# Altium integrated library 刘兴达Lib.IntLib: 614 symbols (part 1 of 4)
Pins are listed as number, name and electrical type; pins without a type are passive.

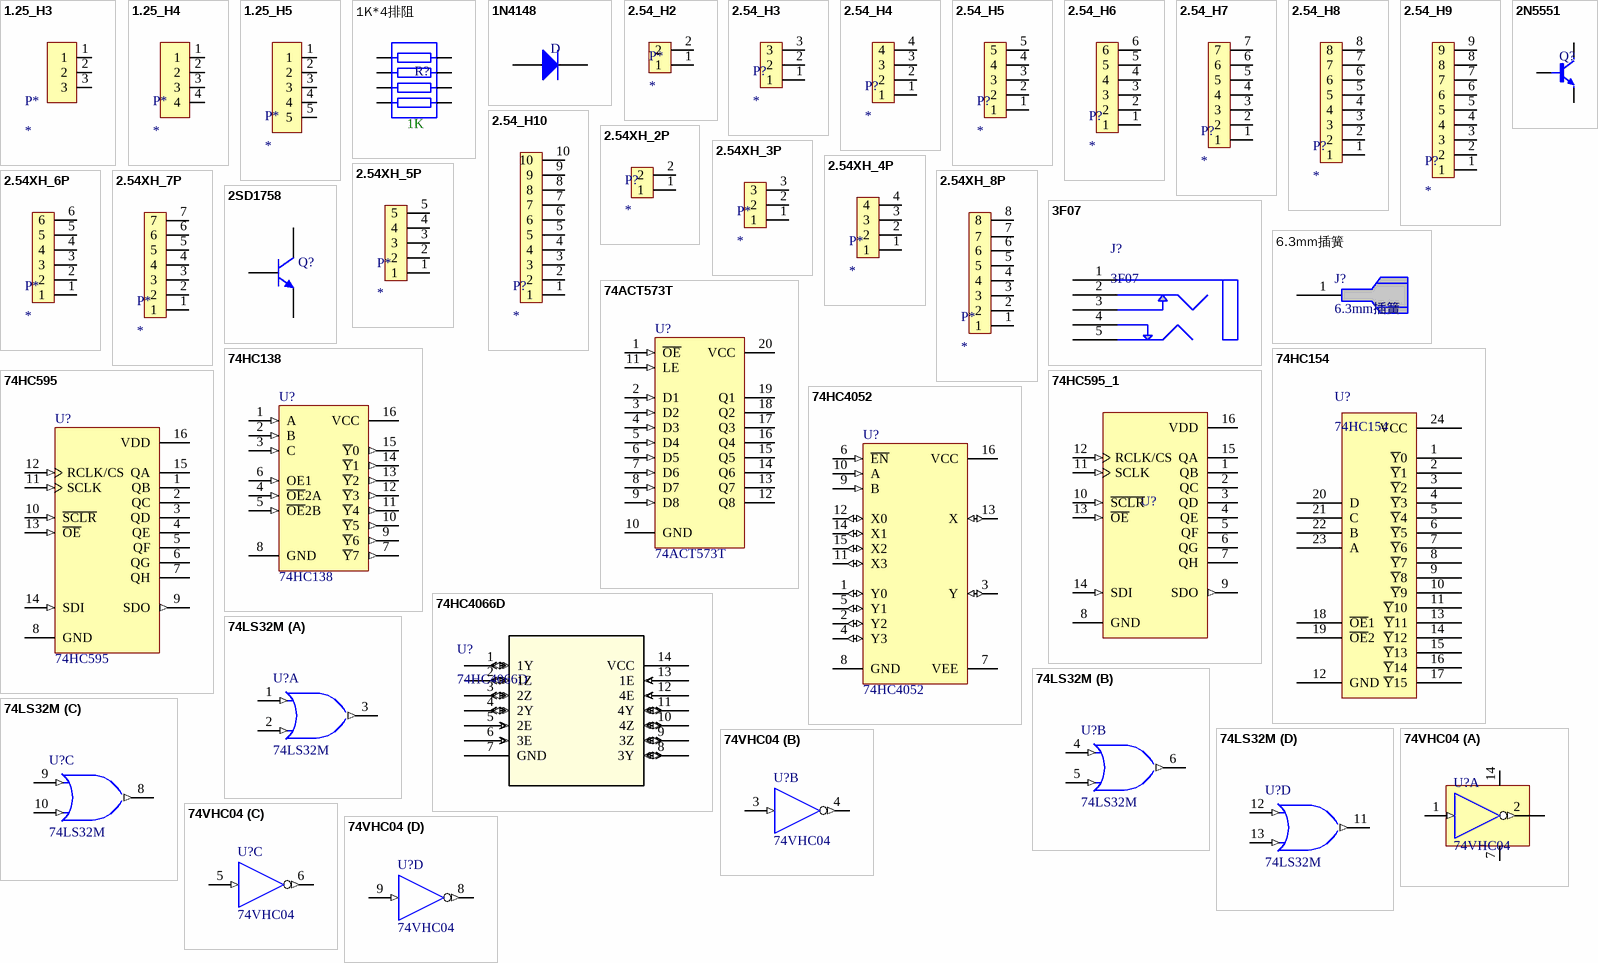
[diagram p0: symbols 1.25_H3 to 74VHC04]

## 1.25_H3
designator P*
footprint 1.25_H3_L
pins: 1, 2, 3

## 1.25_H4
designator P*
footprint 1.25_H4_L
pins: 1, 2, 3, 4

## 1.25_H5
designator P*
footprint 1.25_H5_L
pins: 1, 2, 3, 4, 5

## 1K*4排阻
designator R?  (value not drawn)
footprint 1K*4排阻
pins: 1, 2, 3, 4, 5, 6, 7, 8
text: 1K

## 1N4148
designator D  (value not drawn)
footprint 1N4148
pins: 1 A, 2 K

## 2.54_H2
designator P*
插针
footprint 2.54H_2P
pins: 1, 2

## 2.54_H3
designator P?
插针
footprint 2.54H_3P
pins: 1, 2, 3

## 2.54_H4
designator P?
插针
footprint 2.54H_4P
pins: 1, 2, 3, 4

## 2.54_H5
designator P?
插针
footprint 2.54_H5
footprint 2.54H_5P
pins: 1, 2, 3, 4, 5

## 2.54_H6
designator P?
插针
footprint 2.54H_6P
pins: 1, 2, 3, 4, 5, 6

## 2.54_H7
designator P?
插针
footprint 2.54H_7P
pins: 1, 2, 3, 4, 5, 6, 7

## 2.54_H8
designator P?
插针
footprint 2.54H_8P
pins: 1, 2, 3, 4, 5, 6, 7, 8

## 2.54_H9
designator P?
插针
footprint 2.54H_9P
pins: 1, 2, 3, 4, 5, 6, 7, 8, 9

## 2.54_H10
designator P?
插针
footprint 2.54H_10P
pins: 1, 2, 3, 4, 5, 6, 7, 8, 9, 10

## 2.54XH_2P
designator P?
footprint 2.54XH_2P_L (躺倒的连接器)
footprint 2.54XH_2P_S (垂直的连接器)
pins: 1, 2

## 2.54XH_3P
designator P*
footprint 2.54XH_3P_L (躺倒的插口)
footprint 2.54XH_3P_S (垂直的连接器)
pins: 1, 2, 3

## 2.54XH_4P
designator P*
footprint 2.54XH_4P_L (躺倒的插口)
footprint 2.54XH_4P_S (垂直的连接器)
pins: 1, 2, 3, 4

## 2.54XH_5P
designator P*
footprint 2.54XH_5P_L (躺到的插口)
footprint 2.54XH_5P_S (垂直的连接器)
pins: 1, 2, 3, 4, 5

## 2.54XH_6P
designator P*
footprint 2.54XH_6P_L (躺倒的接口)
footprint 2.54XH_6P_S (垂直的连接器)
pins: 1, 2, 3, 4, 5, 6

## 2.54XH_7P
designator P*
footprint 2.54XH_7P_S
footprint 2.54XH_7P_L
pins: 1, 2, 3, 4, 5, 6, 7

## 2.54XH_8P
designator P*
footprint 2.54XH_8P_S
footprint 2.54XH_8P_L
pins: 1, 2, 3, 4, 5, 6, 7, 8

## 2N5551
designator Q?  (value not drawn)
NPN三极管
footprint 2N5551
pins: 1 b, 2 e, 3 c

## 2SD1758
designator Q?
10W PNP; Published: 8-Jun-2000; LatestRevisionDate: 15-Jan-2003; LatestRevisionNote: PCB Footprint 'BCY-W3/D4.7' replaced; DatasheetVersion: 1997; PackageVersion: Sep-1998; PackageReference: TO-92A; Publisher: Altium Limited; PackageDescription: TO, Flat Index; 3 In-Line, Axial Leads; Body Dia. 4.5mm; Leads 0.51 x 0.48 mm (max); ComponentLink1Description: Manufacturer Link; ComponentLink1URL: http://www.fairchildsemi.com/; ComponentLink2Description: Datasheet; ComponentLink2URL: http://www.fairchildsemi.com/ds/2N%2F2N3904.pdf
footprint TO-252-2
pins: 1 B, 2 C, 3 E

## 3F07
designator J?
立体声耳机插座
footprint 3F07 (立体声耳机插座)
pins: 1 COM, 2 R1, 3 R2, 4 L2, 5 L1

## 6.3mm插簧
designator J?
pins: 1

## 74ACT573T
designator U?
双向数据传输; Published: 8-Jun-2000; LatestRevisionDate: 06-Jun-2005; LatestRevisionNote: Stylized 3D Model Added.; DatasheetVersion: May-1999; PackageReference: TSSOP20; Publisher: Altium Limited; PackageDescription: Shrink Small Outline; 20 Leads; Body Width 4.4 mm; Pitch 0.65 mm; ComponentLink1Description: Manufacturer Link; ComponentLink1URL: http://www.st.com/; ComponentLink2Description: Datasheet; ComponentLink2URL: http://www.st.com/stonline/products/literature/ds/4820/74act573.pdf
footprint TSSOP-20
footprint SOP-20
pins: 1 ~{OE} (in), 2 D1 (in), 3 D2 (in), 4 D3 (in), 5 D4 (in), 6 D5 (in), 7 D6 (in), 8 D7 (in), 9 D8 (in), 10 GND (power), 11 LE (in), 12 Q8 (hiz), 13 Q7 (hiz), 14 Q6 (hiz), 15 Q5 (hiz), 16 Q4 (hiz), 17 Q3 (hiz), 18 Q2 (hiz), 19 Q1 (hiz), 20 VCC (power)

## 74HC138
designator U?
138译码器; Published: 17-Jul-2002; LatestRevisionDate: 13-Apr-2006; LatestRevisionNote: IPC-7351 Footprint Added.; DatasheetVersion: Nov-1999; PackageVersion: 2000; PackageReference: M16D; Publisher: Altium Limited; PackageDescription: 16-Pin Small Outline Package 1.27 mm Pitch; ComponentLink1Description: Manufacturer Link; ComponentLink1URL: http://www.fairchildsemi.com/; ComponentLink2Description: Datasheet; ComponentLink2URL: http://www.fairchildsemi.com/ds/74%2F74AC138.pdf
footprint SOIC-16
footprint DIP-16 (双列直插)
pins: 1 A (in), 2 B (in), 3 C (in), 4 ~{OE}2A (in), 5 ~{OE}2B (in), 6 OE1 (in), 7 ~{Y}7 (out), 8 GND (power), 9 ~{Y}6 (out), 10 ~{Y}5 (out), 11 ~{Y}4 (out), 12 ~{Y}3 (out), 13 ~{Y}2 (out), 14 ~{Y}1 (out), 15 ~{Y}0 (out), 16 VCC (power)

## 74HC154
designator U?
4-16译码器
footprint SOIC-24 (74hc154)
footprint DIP-24 (DIP; 24,74ls154)
pins: 1 ~{Y}0 (power), 2 ~{Y}1 (power), 3 ~{Y}2 (power), 4 ~{Y}3 (power), 5 ~{Y}4 (power), 6 ~{Y}5 (power), 7 ~{Y}6 (power), 8 ~{Y}7 (power), 9 ~{Y}8 (power), 10 ~{Y}9 (power), 11 ~{Y}10 (power), 12 GND (power), 13 ~{Y}11 (power), 14 ~{Y}12 (power), 15 ~{Y}13 (power), 16 ~{Y}14 (power), 17 ~{Y}15 (power), 18 ~{OE}1 (power), 19 ~{OE}2 (power), 20 D (power), 21 C (power), 22 B (power), 23 A (power), 24 VCC (power)

## 74HC595
designator U?
移位寄存器; ComponentAvailability: Not for New Design; Published: 15-Apr-2002; LatestRevisionDate: 13-Apr-2006; LatestRevisionNote: IPC-7351 Footprint Added.; DatasheetVersion: 1997; PackageVersion: 1997; PackageReference: 966-01; Publisher: Altium Limited; PackageDescription: 16-Pin Small Outline Package 1.27 mm Pitch; ComponentLink1Description: Manufacturer Link; ComponentLink1URL: http://www.onsemi.com/; ComponentLink2Description: Datasheet; ComponentLink2URL: http://www.onsemi.com/pub/Collateral/MC74VHC595-D.PDF
footprint DIP-16 (双列直插)
footprint SOIC-16
pins: 1 QB (hiz), 2 QC (hiz), 3 QD (hiz), 4 QE (hiz), 5 QF (hiz), 6 QG (hiz), 7 QH (hiz), 8 GND (power), 9 SDO (out), 10 ~{SCLR} (in), 11 SCLK (in), 12 RCLK/CS (in), 13 ~{OE} (in), 14 SDI (in), 15 QA (hiz), 16 VDD (power)

## 74HC595_1
designator U?  (value not drawn)
锁存器
footprint 74HC595
pins: 1 QB (hiz), 2 QC (hiz), 3 QD (hiz), 4 QE (hiz), 5 QF (hiz), 6 QG (hiz), 7 QH (hiz), 8 GND (power), 9 SDO (out), 10 ~{SCLR} (in), 11 SCLK (in), 12 RCLK/CS (in), 13 ~{OE} (in), 14 SDI (in), 15 QA (hiz), 16 VDD (power)

## 74HC4052
designator U?
双通道模拟开关; Published: 8-Jun-2000; LatestRevisionDate: 13-Apr-2006; LatestRevisionNote: IPC-7351 Footprint Added.; DatasheetVersion: Oct-1993; PackageVersion: May-1998; PackageReference: SO16; Publisher: Altium Limited; PackageDescription: 16-Pin Small Outline Integrated Circuit 1.27 mm Pitch; Code_IPC: SOIC127P600-16; ComponentLink1Description: Manufacturer Link; ComponentLink1URL: http://www.st.com/; ComponentLink2Description: Datasheet; ComponentLink2URL: http://www.st.com/stonline/products/literature/ds/7730/m74hc4052.pdf
footprint SOIC-16
footprint DIP-16 (双列直插)
pins: 1 Y0 (io), 2 Y2 (io), 3 Y (io), 4 Y3 (io), 5 Y1 (io), 6 ~{EN} (in), 7 VEE (power), 8 GND (power), 9 B (in), 10 A (in), 11 X3 (io), 12 X0 (io), 13 X (io), 14 X1 (io), 15 X2 (io), 16 VCC (power)

## 74HC4066D
designator U?
Vendor: Nexperia; SourceLibrary: Nexperia_2018-05-2018; Manufacturer_Part_Number: 74HC4066D; Copyright: Copyright (C) 2016 Accelerated Designs. All rights reserved; RefDes: RefDes; Type: DEV
footprint TSSOP-14
pins: 1 1Y (io), 2 1Z (io), 3 2Z (io), 4 2Y (io), 5 2E (in), 6 3E (in), 7 GND (power), 8 3Y (io), 9 3Z (io), 10 4Z (io), 11 4Y (io), 12 4E (in), 13 1E (in), 14 VCC (power)

## 74LS32M
designator U?
双输入或门; Published: 15-Apr-2002; LatestRevisionDate: 13-Apr-2006; LatestRevisionNote: IPC-7351 Footprint Added.; DatasheetVersion: May-1989; PackageVersion: 2000; PackageReference: M14A; Publisher: Altium Limited; PackageDescription: 14-Pin Small Outline Integrated Circuit 1.27 mm Pitch; Code_IPC: SOIC127P600-14; ComponentLink1Description: Manufacturer Link; ComponentLink1URL: http://www.national.com/; ComponentLink2Description: Datasheet; ComponentLink2URL: http://www.national.com/ds.cgi/54/54LS32.pdf; ComponentLink3Description: URL Link1; ComponentLink3URL: http://www.national.com/pf/DM/DM54LS32.html
footprint SOIC-14 (SOP, 14-Leads,)
pins on every part: 7 GND (power) hidden to GND, 14 VCC (power) hidden to VCC
part A pins: 1 A (in), 2 B (in), 3 Y (out)
part B pins: 4 A (in), 5 B (in), 6 Y (out)
part C pins: 8 Y (out), 9 A (in), 10 B (in)
part D pins: 11 Y (out), 12 A (in), 13 B (in)

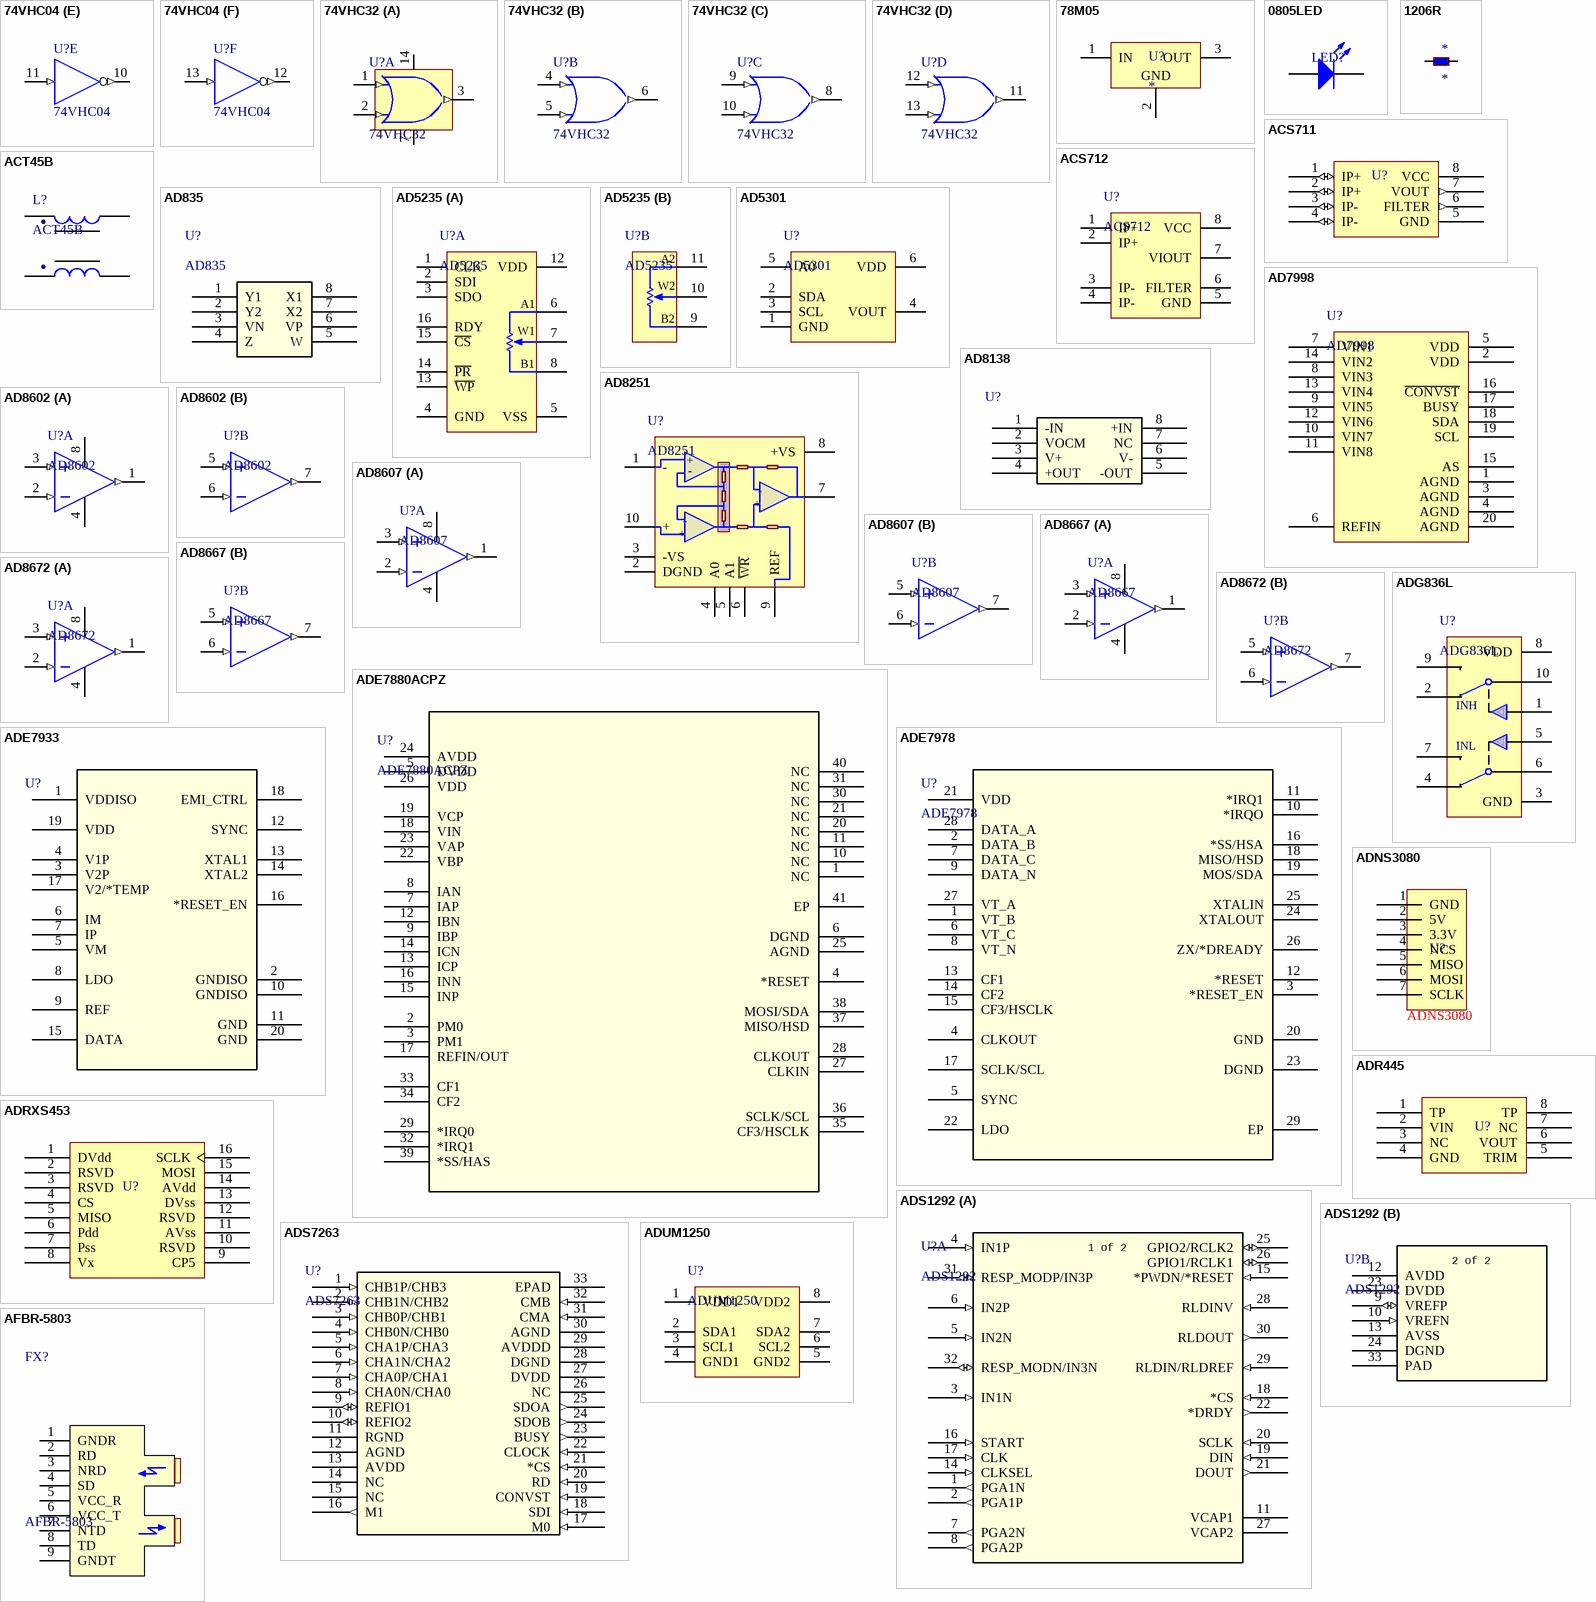
[diagram p1: symbols 74VHC04 to AFBR-5803]

## 74VHC04
designator U?
非门; IC_Technology: S; Published: 17-Jul-2002; LatestRevisionDate: 13-Apr-2006; LatestRevisionNote: IPC-7351 Footprint Added.; DatasheetVersion: Mar-1998; PackageVersion: 2000; PackageReference: M14A; Publisher: Altium Limited; PackageDescription: 14-Pin Small Outline Integrated Circuit 1.27 mm Pitch; Code_IPC: SOIC127P600-14; ComponentLink1Description: Manufacturer Link; ComponentLink1URL: http://www.fairchildsemi.com/
footprint SOIC-14 (SOP, 14-Leads,)
part A pins: 1 A (in), 2 Y (out), 7 GND (power), 14 VCC (power)
part B pins: 3 A (in), 4 Y (out)
part C pins: 5 A (in), 6 Y (out)
part D pins: 8 Y (out), 9 A (in)
part E pins: 10 Y (out), 11 A (in)
part F pins: 12 Y (out), 13 A (in)

## 74VHC32
designator U?
双输入或门; Published: 15-Apr-2002; LatestRevisionDate: 13-Apr-2006; LatestRevisionNote: IPC-7351 Footprint Added.; DatasheetVersion: May-1989; PackageVersion: 2000; PackageReference: M14A; Publisher: Altium Limited; PackageDescription: 14-Pin Small Outline Integrated Circuit 1.27 mm Pitch; Code_IPC: SOIC127P600-14; ComponentLink1Description: Manufacturer Link; ComponentLink1URL: http://www.national.com/; ComponentLink2Description: Datasheet; ComponentLink2URL: http://www.national.com/ds.cgi/54/54LS32.pdf; ComponentLink3Description: URL Link1; ComponentLink3URL: http://www.national.com/pf/DM/DM54LS32.html
footprint SOIC-14 (SOP, 14-Leads,)
part A pins: 1 A (in), 2 B (in), 3 Y (out), 7 GND (power), 14 VCC (power)
part B pins: 4 A (in), 5 B (in), 6 Y (out)
part C pins: 8 Y (out), 9 A (in), 10 B (in)
part D pins: 11 Y (out), 12 A (in), 13 B (in)

## 78M05
designator U?
5V稳压
footprint 78M05
pins: 1 IN (power), 2 GND (power), 3 OUT (power)

## 0805LED
designator LED?  (value not drawn)
footprint LED-0805 (贴片LED)
pins: 1 A, 2 K

## 1206R
designator *
电阻1206
footprint 1206
pins: 1, 2

## ACS711
designator U?  (value not drawn)
霍尔电流采样
footprint SOIC-NB-8
pins: 1 IP+ (io), 2 IP+ (io), 3 IP- (io), 4 IP- (io), 5 GND (power), 6 FILTER (out), 7 VOUT (out), 8 VCC (power)

## ACS712
designator U?
电流检测芯片
footprint SOIC-8
pins: 1 IP+, 2 IP+, 3 IP-, 4 IP-, 5 GND, 6 FILTER, 7 VIOUT, 8 VCC

## ACT45B
designator L?
共模电感
footprint L-TDK
pins: 1, 2, 3, 4
text: .

## AD835
designator U?
乘法器; Manufacturer_Part_Number: AD835ARZ; Vendor: Vendor; Value: Value; Type: Type; RefDes: Refdes
footprint SOIC-8 (3mm)
pins: 1 Y1, 2 Y2, 3 VN (power), 4 Z, 5 W, 6 VP (power), 7 X2, 8 X1

## AD5235
designator U?
数控电阻
footprint TSSOP-16 (TSOP, 16-Leads, Body 5x4.4mm, Pitch 0.65mm, IPC Low Density)
part A pins: 1 CLK, 2 SDI, 3 SDO, 4 GND, 5 VSS, 6 A1, 7 W1, 8 B1, 12 VDD, 13 ~{WP}, 14 ~{PR}, 15 ~{CS}, 16 RDY
part B pins: 9 B2, 10 W2, 11 A2

## AD5301
designator U?
DAC
footprint SOT23-6 (Max4173)
pins: 1 GND, 2 SDA, 3 SCL, 4 VOUT, 5 A0, 6 VDD

## AD7998
designator U?
12BIT,ADC
footprint TSSOP-20
pins: 1 AGND, 2 VDD, 3 AGND, 4 AGND, 5 VDD, 6 REFIN, 7 VIN1, 8 VIN3, 9 VIN5, 10 VIN7, 11 VIN8, 12 VIN6, 13 VIN4, 14 VIN2, 15 AS, 16 ~{CONVST}, 17 BUSY, 18 SDA, 19 SCL, 20 AGND

## AD8138
designator U?
全差分运放; Manufacturer_Part_Number: AD8138ARZ; Vendor: Vendor; Value: Value; Type: Type; RefDes: Refdes
footprint SOIC-8 (3mm)
pins: 1 -IN, 2 VOCM, 3 V+ (power), 4 +OUT, 5 -OUT, 6 V- (power), 7 NC, 8 +IN

## AD8251
designator U?
可控增益运放
footprint MSOP-10 (TSSOP)
pins: 1 -, 2 DGND, 3 -VS, 4 A0, 5 A1, 6 ~{WR}, 7 OUT, 8 +VS, 9  REF, 10 +

## AD8602
designator U?
双运放
footprint SOIC-8
part A pins: 1 OUT (out), 2 IN- (in), 3 IN+ (in), 4 V-, 8 V+
part B pins: 5 IN+ (in), 6 IN- (in), 7 OUT (out)

## AD8607
designator U?
双运放
footprint SOIC-8
part A pins: 1 OUT (out), 2 IN- (in), 3 IN+ (in), 4 V-, 8 V+
part B pins: 5 IN+ (in), 6 IN- (in), 7 OUT (out)

## AD8667
designator U?
双运放
footprint SOIC-8
part A pins: 1 OUT (out), 2 IN- (in), 3 IN+ (in), 4 V-, 8 V+
part B pins: 5 IN+ (in), 6 IN- (in), 7 OUT (out)

## AD8672
designator U?
双运放
footprint SOIC-8
part A pins: 1 OUT (out), 2 IN- (in), 3 IN+ (in), 4 V-, 8 V+
part B pins: 5 IN+ (in), 6 IN- (in), 7 OUT (out)

## ADE7880ACPZ
designator U?
三相电能计量; Vendor: Analog Devices Inc; Built_By: Analog Devices Inc.; Manufacturer_Part_Number: ADE7880ACPZ; Copyright: Copyright (C) 2018 Accelerated Designs. All rights reserved; RefDes: RefDes; Type: DEV; Value: Value
footprint LFCSP-40
pins: 1 NC, 2 PM0, 3 PM1, 4 *RESET, 5 DVDD, 6 DGND, 7 IAP, 8 IAN, 9 IBP, 10 NC, 11 NC, 12 IBN, 13 ICP, 14 ICN, 15 INP, 16 INN, 17 REFIN/OUT, 18 VIN, 19 VCP, 20 NC, 21 NC, 22 VBP, 23 VAP, 24 AVDD, 25 AGND, 26 VDD, 27 CLKIN, 28 CLKOUT, 29 *IRQ0, 30 NC, 31 NC, 32 *IRQ1, 33 CF1, 34 CF2, 35 CF3/HSCLK, 36 SCLK/SCL, 37 MISO/HSD, 38 MOSI/SDA, 39 *SS/HAS, 40 NC, 41 EP

## ADE7933
designator U?
隔离电压电流ADC; Manufacturer_Part_Number: ADE7933ARIZ; Vendor: Analog Devices Inc; Built_By: EMA_UL_Team; Copyright: Copyright (C) 2018 Accelerated Designs. All rights reserved; RefDes: RefDes; Type: DEV; Value: Value
footprint SOIC-20
pins: 1 VDDISO, 2 GNDISO, 3 V2P, 4 V1P, 5 VM, 6 IM, 7 IP, 8 LDO, 9 REF, 10 GNDISO, 11 GND, 12 SYNC, 13 XTAL1, 14 XTAL2, 15 DATA, 16 *RESET_EN, 17 V2/*TEMP, 18 EMI_CTRL, 19 VDD, 20 GND

## ADE7978
designator U?
三相电能计量（搭配ADE7933/32）; Manufacturer_Part_Number: ADE7978ACPZ; Vendor: Analog Devices Inc; Built_By: EMA_UL_Team; Copyright: Copyright (C) 2018 Accelerated Designs. All rights reserved; RefDes: RefDes; Type: DEV; Value: Value
footprint LFCSP-28
pins: 1 VT_B, 2 DATA_B, 3 *RESET_EN, 4 CLKOUT, 5 SYNC, 6 VT_C, 7 DATA_C, 8 VT_N, 9 DATA_N, 10 *IRQO, 11 *IRQ1, 12 *RESET, 13 CF1, 14 CF2, 15 CF3/HSCLK, 16 *SS/HSA, 17 SCLK/SCL, 18 MISO/HSD, 19 MOS/SDA, 20 GND, 21 VDD, 22 LDO, 23 DGND, 24 XTALOUT, 25 XTALIN, 26 ZX/*DREADY, 27 VT_A, 28 DATA_A, 29 EP

## ADG836L
designator U?
单刀双掷数字开关
footprint MSOP-10 (TSSOP)
pins: 1 IN1, 2 SA, 3 GND, 4 S2A, 5 IN2, 6 D2, 7 S2B, 8 VDD, 9 S1B, 10 D1
text: INH; INL

## ADNS3080
designator U?  (value not drawn)
光流
footprint ADNS3080 (光流)
pins: 1 GND, 2 5V, 3 3.3V, 4 NCS, 5 MISO, 6 MOSI, 7 SCLK

## ADR445
designator U?  (value not drawn)
footprint ADR445
pins: 1 TP, 2 VIN, 3 NC, 4 GND, 5 TRIM, 6 VOUT, 7 NC, 8 TP

## ADRXS453
designator U?  (value not drawn)
footprint ADRXS453
pins: 1 DVdd, 2 RSVD, 3 RSVD, 4 CS, 5 MISO, 6 Pdd, 7 Pss, 8 Vx, 9 CP5, 10 RSVD, 11 AVss, 12 RSVD, 13 DVss, 14 AVdd, 15 MOSI, 16 SCLK

## ADS1292
designator U?
Manufacturer: Texas Instruments; Manufacturer_Part_Number: ADS1292RIPBS; Built_By: EMA_UL_Team; Vendor: Texas Instruments; Copyright: Copyright (C) 2018 Accelerated Designs. All rights reserved; RefDes: RefDes; Type: DEV
footprint VQFN-32
part A pins: 1 PGA1N (out), 2 PGA1P (out), 3 IN1N (in), 4 IN1P (in), 5 IN2N (in), 6 IN2P (in), 7 PGA2N (out), 8 PGA2P (out), 11 VCAP1, 14 CLKSEL (in), 15 *PWDN/*RESET (in), 16 START (in), 17 CLK (in), 18 *CS (in), 19 DIN (in), 20 SCLK (in), 21 DOUT (out), 22 *DRDY (out), 25 GPIO2/RCLK2 (io), 26 GPIO1/RCLK1 (io), 27 VCAP2, 28 RLDINV (in), 29 RLDIN/RLDREF (in), 30 RLDOUT (out), 31 RESP_MODP/IN3P (io), 32 RESP_MODN/IN3N (io)
part B pins: 9 VREFP (io), 10 VREFN (in), 12 AVDD (power), 13 AVSS (power), 23 DVDD (power), 24 DGND (power), 33 PAD (power)
part A text: 1 of 2
part B text: 2 of 2

## ADS7263
designator U?
QSPI同步ADC; Manufacturer: Texas Instruments; Manufacturer_Part_Number: ADS7263SRHBT; Built_By: EMA_UL_Team; Vendor: Texas Instruments; Copyright: Copyright (C) 2018 Accelerated Designs. All rights reserved; RefDes: RefDes; Type: DEV; Value: Value
footprint VQFN-32
pins: 1 CHB1P/CHB3 (in), 2 CHB1N/CHB2 (in), 3 CHB0P/CHB1 (in), 4 CHB0N/CHB0 (in), 5 CHA1P/CHA3 (in), 6 CHA1N/CHA2 (in), 7 CHA0P/CHA1 (in), 8 CHA0N/CHA0 (in), 9 REFIO1 (io), 10 REFIO2 (io), 11 RGND (power), 12 AGND (power), 13 AVDD (power), 14 NC, 15 NC, 16 M1 (out), 17 M0 (in), 18 SDI (in), 19 CONVST (in), 20 RD (in), 21 *CS (in), 22 CLOCK (in), 23 BUSY (out), 24 SDOB (out), 25 SDOA (out), 26 NC, 27 DVDD (power), 28 DGND (power), 29 AVDDD (power), 30 AGND (power), 31 CMA (in), 32 CMB (in), 33 EPAD (power)

## ADUM1250
designator U?
双向隔离
footprint SOIC-8
pins: 1 VDD1, 2 SDA1, 3 SCL1, 4 GND1, 5 GND2, 6 SCL2, 7 SDA2, 8 VDD2

## AFBR-5803
designator FX?
光以太网
footprint AFBR-5803-ST (光以太网)
pins: 1 GNDR, 2 RD, 3 NRD, 4 SD, 5 VCC_R, 6 VCC_T, 7 NTD, 8 TD, 9 GNDT, 10 hidden to EARTH, 11 hidden to EARTH

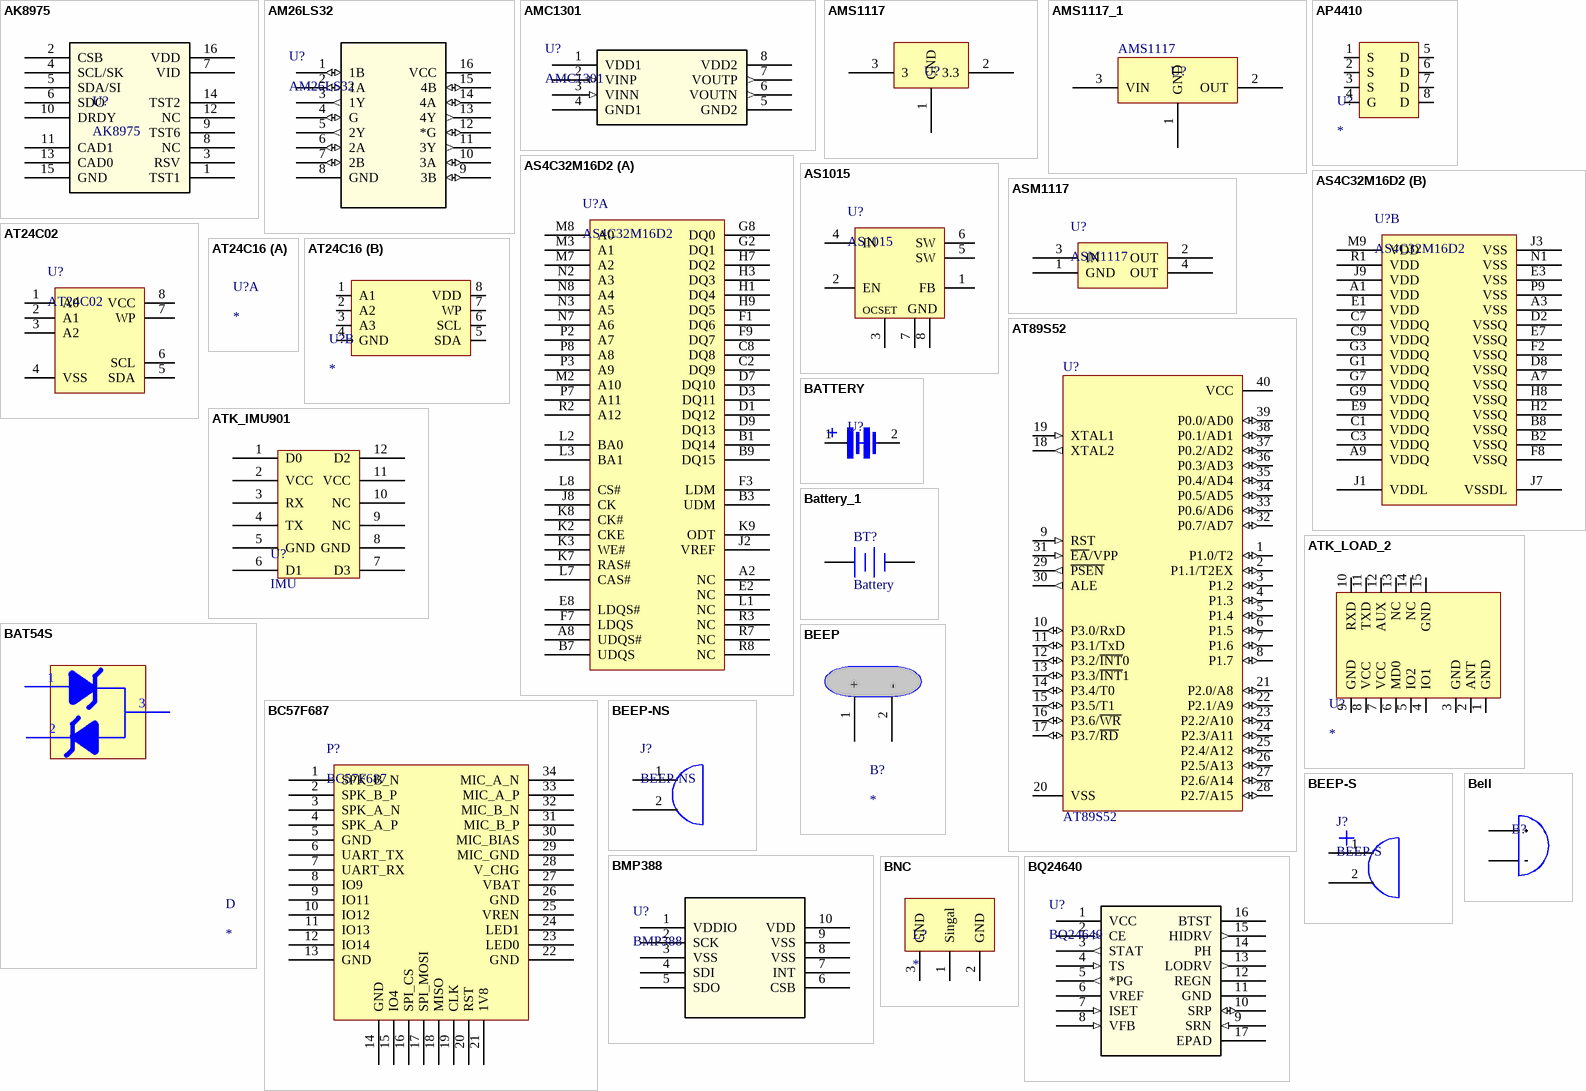
[diagram p2: symbols AK8975 to BQ24640]

## AK8975
designator U?
3线电子罗盘
footprint QFN-16 4*4
pins: 1 TST1, 2 CSB, 3 RSV, 4 SCL/SK, 5 SDA/SI, 6 SDO, 7 VID, 8 NC, 9 TST6, 10 DRDY, 11 CAD1, 12 NC, 13 CAD0, 14 TST2, 15 GND, 16 VDD

## AM26LS32
designator U?
四路差动数字接收器; Manufacturer_Part_Number: AM26LS32ACD; Vendor: Texas Instruments; Built_By: EMA_UL_Team; Copyright: Copyright (C) 2018 Accelerated Designs. All rights reserved; RefDes: RefDes; Type: DEV; Value: Value
footprint SOIC-16
pins: 1 1B (io), 2 1A (io), 3 1Y (out), 4 G (io), 5 2Y (out), 6 2A (io), 7 2B (io), 8 GND (power), 9 3B (io), 10 3A (io), 11 3Y (out), 12 *G (io), 13 4Y (out), 14 4A (io), 15 4B (io), 16 VCC (power)

## AMC1301
designator U?
∑-Δ隔离电流采样; Manufacturer_Part_Number: AMC1301QDWVRQ1; Vendor: Texas Instruments; Built_By: EMA_Jessica; Copyright: Copyright (C) 2018 Accelerated Designs. All rights reserved; RefDes: RefDes; Type: DEV; Value: Value
footprint SOIC-8 (5mm)
pins: 1 VDD1 (power), 2 VINP (in), 3 VINN (in), 4 GND1, 5 GND2, 6 VOUTN (out), 7 VOUTP (out), 8 VDD2 (power)

## AMS1117
designator U?  (value not drawn)
3.3V稳压电源
footprint AMS1117
pins: 1 GND, 2 3.3, 3

## AMS1117_1
designator U?  (value not drawn)
AMS1117 SOT223
footprint SOT223
pins: 1 GND, 2 OUT, 3 VIN

## AP4410
designator U?
NMOS 30V15A
footprint SOP8_N
pins: 1 S, 2 S, 3 S, 4 G, 5 D, 6 D, 7 D, 8 D

## AS4C32M16D2
designator U?
DDR2 SDRAM
footprint FBGA84
part A pins: A2 NC, A8 UDQS#, B1 DQ14, B3 UDM, B7 UDQS, B9 DQ15, C2 DQ9, C8 DQ8, D1 DQ12, D3 DQ11, D7 DQ10, D9 DQ13, E2 NC, E8 LDQS#, F1 DQ6, F3 LDM, F7 LDQS, F9 DQ7, G2 DQ1, G8 DQ0, H1 DQ4, H3 DQ3, H7 DQ2, H9 DQ5, J2 VREF, J8 CK, K2 CKE, K3 WE#, K7 RAS#, K8 CK#, K9 ODT, L1 NC, L2 BA0, L3 BA1, L7 CAS#, L8 CS#, M2 A10, M3 A1, M7 A2, M8 A0, N2 A3, N3 A5, N7 A6, N8 A4, P2 A7, P3 A9, P7 A11, P8 A8, R2 A12, R3 NC, R7 NC, R8 NC
part B pins: A1 VDD, A3 VSS, A7 VSSQ, A9 VDDQ, B2 VSSQ, B8 VSSQ, C1 VDDQ, C3 VDDQ, C7 VDDQ, C9 VDDQ, D2 VSSQ, D8 VSSQ, E1 VDD, E3 VSS, E7 VSSQ, E9 VDDQ, F2 VSSQ, F8 VSSQ, G1 VDDQ, G3 VDDQ, G7 VDDQ, G9 VDDQ, H2 VSSQ, H8 VSSQ, J1 VDDL, J3 VSS, J7 VSSDL, J9 VDD, M9 VDD, N1 VSS, P9 VSS, R1 VDD

## AS1015
designator U?
可调升压芯片
footprint SOIC-8
pins: 1 FB (power), 2 EN (power), 3 OCSET (power), 4 IN (power), 5 SW (power), 6 SW (power), 7 GND (power), 8 GND (power)

## ASM1117
designator U?
3.3V稳压芯片
footprint SOT223
pins: 1 GND, 2 OUT, 3 IN, 4 OUT

## AT24C02
designator U?
EEROM存储器
footprint SOIC-8
pins: 1 A0, 2 A1, 3 A2, 4 VSS, 5 SDA, 6 SCL, 7 WP, 8 VCC

## AT24C16
designator U?
footprint SOIC-8
part B pins: 1 A1, 2 A2, 3 A3, 4 GND, 5 SDA, 6 SCL, 7 WP, 8 VDD

## AT89S52
designator U?
51系列单片机; Published: 21-May-2003; DatasheetVersion: 5-Jun-2002; PackageVersion: Aug-2000; PackageReference: SOT129-1; Publisher: Altium Limited; PackageDescription: DIP, Plastic; 40 Leads; Row Spacing 15.24 mm; Pitch 2.54 mm; Code_JEDEC: MO-015; ComponentLink1Description: Manufacturer Link; ComponentLink1URL: http://www-us2.semiconductors.philips.com/; ComponentLink2Description: Datasheet; ComponentLink2URL: http://www.semiconductors.philips.com/acrobat/datasheets/P89C5XX2_2.pdf
footprint DIP-40 (51单片机)
pins: 1 P1.0/T2 (io), 2 P1.1/T2EX (io), 3 P1.2 (io), 4 P1.3 (io), 5 P1.4 (io), 6 P1.5 (io), 7 P1.6 (io), 8 P1.7 (io), 9 RST (in), 10 P3.0/RxD (io), 11 P3.1/TxD (io), 12 P3.2/~{INT}0 (io), 13 P3.3/~{INT}1 (io), 14 P3.4/T0 (io), 15 P3.5/T1 (io), 16 P3.6/~{WR} (io), 17 P3.7/~{RD} (io), 18 XTAL2 (out), 19 XTAL1 (in), 20 VSS (power), 21 P2.0/A8 (io), 22 P2.1/A9 (io), 23 P2.2/A10 (io), 24 P2.3/A11 (io), 25 P2.4/A12 (io), 26 P2.5/A13 (io), 27 P2.6/A14 (io), 28 P2.7/A15 (io), 29 ~{PSEN} (out), 30 ALE (out), 31 ~{EA}/VPP (in), 32 P0.7/AD7 (io), 33 P0.6/AD6 (io), 34 P0.5/AD5 (io), 35 P0.4/AD4 (io), 36 P0.3/AD3 (io), 37 P0.2/AD2 (io), 38 P0.1/AD1 (io), 39 P0.0/AD0 (io), 40 VCC (power)

## ATK_IMU901
designator U?, comment IMU
十轴传感器
footprint ATK_IMU901 (十轴传感器)
pins: 1 D0, 2 VCC, 3 RX, 4 TX, 5 GND, 6 D1, 7 D3, 8 GND, 9 NC, 10 NC, 11 VCC, 12 D2

## ATK_LOAD_2
designator U?
射频
footprint ATK_LORA_02 (射频)
pins: 1 GND, 2 ANT, 3 GND, 4 IO1, 5 IO2, 6 MD0, 7 VCC, 8 VCC, 9 GND, 10 RXD, 11 TXD, 12 AUX, 13 NC, 14 NC, 15 GND

## BAT54S
designator D
肖特基二极管对管
footprint SOT-23-3
pins: 1 5, 2 6, 3 7

## BATTERY
designator U?  (value not drawn)
纽扣电池
footprint BATTERY
pins: 1 +, 2 -

## Battery_1
designator BT?, comment Battery
备份电池; Published: 24-Mar-1999; LatestRevisionDate: 17-Jul-2002; LatestRevisionNote: Re-released for DXP Platform.; PackageReference: BAT-2; Publisher: Altium Limited
footprint CR1220 (钮扣电池)
pins: 1 +, 2 -

## BC57F687
designator P?
蓝牙音频模块
footprint HDR34_BT (蓝牙模块)
pins: 1 SPK_B_N, 2 SPK_B_P, 3 SPK_A_N, 4 SPK_A_P, 5 GND, 6 UART_TX, 7 UART_RX, 8 IO9, 9 IO11, 10 IO12, 11 IO13, 12 IO14, 13 GND, 14 GND, 15 IO4, 16 SPI_CS, 17 SPI_MOSI, 18 MISO, 19 CLK, 20 RST, 21 1V8, 22 GND, 23 LED0, 24 LED1, 25 VREN, 26 GND, 27 VBAT, 28 V_CHG, 29 MIC_GND, 30 MIC_BIAS, 31 MIC_B_P, 32 MIC_B_N, 33 MIC_A_P, 34 MIC_A_N

## BEEP
designator B?
蜂鸣器（小）
footprint BEEP (蜂鸣器（小）)
pins: 1 +, 2 -

## BEEP-NS
designator J?
无源蜂鸣器
footprint BEEP-NS (无源蜂鸣器)
pins: 1 0, 2 1

## BEEP-S
designator J?
有源蜂鸣器
footprint BEEP-S (有源蜂鸣器)
pins: 1 0, 2 1

## Bell
designator B?  (value not drawn)
蜂鸣器
footprint BELL11.9
footprint Bell9.2
pins: 1 A, 2 B

## BMP388
designator U?
气压传感器; Built_By: EMA_Matt; Vendor: Bosch; Manufacturer_Part_Number: BMP388; Copyright: Copyright (C) 2018 Accelerated Designs. All rights reserved; RefDes: RefDes; Type: DEV; Value: Value
footprint LGA-10 2*2
pins: 1 VDDIO (power), 2 SCK, 3 VSS, 4 SDI, 5 SDO, 6 CSB, 7 INT, 8 VSS, 9 VSS, 10 VDD (power)

## BNC
designator L?
BNC同轴连接器
footprint BNC (BNC同轴连接器)
pins: 1 Singal, 2 GND, 3 GND

## BQ24640
designator U?
超级电容充电器; Manufacturer: Texas Instruments; Manufacturer_Part_Number: BQ24640RVAT; Built_By: EMA_UL_Team; Vendor: Vendor; Copyright: Copyright (C) 2018 Accelerated Designs. All rights reserved; RefDes: RefDes; Type: DEV; Value: Value
footprint VQFN-16
pins: 1 VCC (power), 2 CE (in), 3 STAT (out), 4 TS (in), 5 *PG (out), 6 VREF (power), 7 ISET (in), 8 VFB (in), 9 SRN (in), 10 SRP (io), 11 GND (power), 12 REGN (power), 13 LODRV (out), 14 PH (power), 15 HIDRV (out), 16 BTST (power), 17 EPAD (power)
